# Altium footprint library Discretes.PcbLib: 81 footprints (part 6 of 6)
Each footprint in its own frame and in the unit in brackets; x right, y up, seen from the top. Pads: shape width x height; smd on the part's side, far side on the other; paste and mask are expansions set on the pad; w line width, h text height; cw(c..) or ccw(c..) is an arc to the next point about the centre after c.
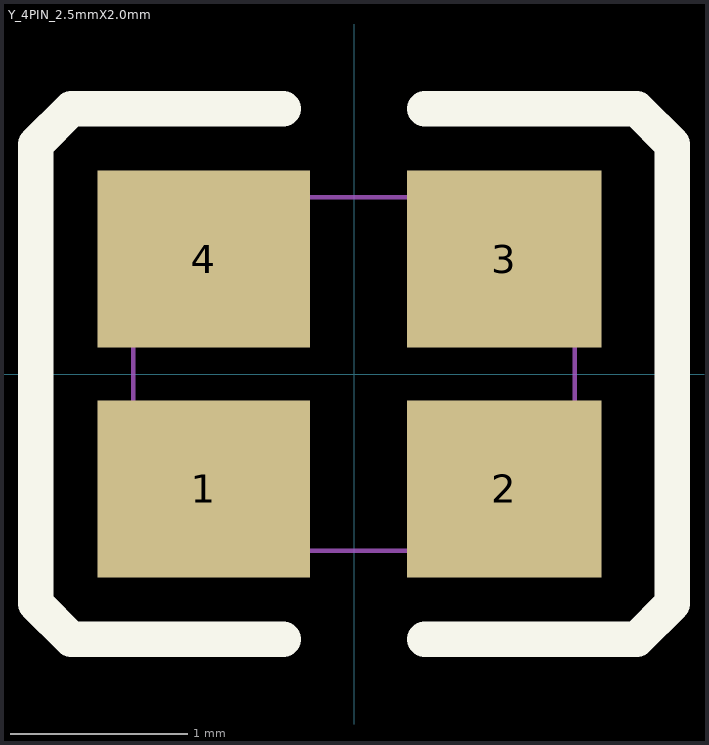
[diagram p5: the footprint, top view; thin cyan lines are the x and y axes]

## Y_4PIN_2.5mmX2.0mm [mm] "Crystal 4 Pin SMD Package"
height 0.55
pads (4):
  rect 1.2x1 smd: 1(-0.85,-0.65) 4(-0.85,0.65)
  rect 1.1x1 smd: 2(0.85,-0.65) 3(0.85,0.65)
Top Overlay:
  lines w0.2: -0.4,-1.5 -1.6,-1.5 -1.8,-1.3 -1.8,1.3 -1.6,1.5 -0.4,1.5 ; 0.4,-1.5 1.6,-1.5 1.8,-1.3 1.8,1.3 1.6,1.5 0.4,1.5
Mechanical 1:
  lines w0.025: -1.25,-0.85 -1.1,-1 1.1,-1 1.25,-0.85 1.25,0.85 1.1,1 -1.1,1 -1.25,0.85 -1.25,-0.85
  text ".Designator" at -0.45,1.725 h1
3D body: height 0.55, standoff 0, extent -1.25,-1 1.25,1